# Altium schematic symbol library Hydra_Ref_sch.SCHLIB: 791 symbols (part 4 of 5) (continued)
## RK40-01500
designator R?, comment value 150  (hidden comment: 150 OHMS;.06W;1%;200PPM;FILM;CHIP;0603)
NoLoad: .; MFGR: ANY; Approved: CL; G_PN: RK40-01500; level: 1; ModifyDate: 11/20/12; M_PN: ANY; item_number: RK40-01500
footprint RES-0603-N (0603 Footprint)
pins: 1, 2

## RK40-01780
designator R?, comment value 178  (hidden comment: 178 OHMS;.1W;1%;200PPM;FILM;CHIP;0603)
NoLoad: .; MFGR: VENKEL; M_PN: CR0603-10W-1780FT; Approved: CL; G_PN: RK40-01780; level: 1; ModifyDate: 3/27/13; item_number: RK40-01780
footprint RES-0603-N (0603 Footprint)
pins: 1, 2

## RK40-02000
designator R?, comment value 200  (hidden comment: 200 OHMS;.06W;1%;200PPM;FILM;CHIP;0603)
NoLoad: .; MFGR: ANY; Approved: NM; G_PN: RK40-02000; level: 1; ModifyDate: 11/12/12; M_PN: ANY; item_number: RK40-02000
footprint RES-0603-N (0603 Footprint)
pins: 1, 2

## RK40-03010
designator R?, comment value 301  (hidden comment: 301 OHMS;.06W;1%;100PPM;FILM;CHIP;0603)
Approved: NM; G_PN: RK40-03010; NoLoad: .; MFGR: ANY; level: 1; ModifyDate: 3/18/13; M_PN: ANY; item_number: RK40-03010
footprint RES-0603-N (0603 Footprint)
pins: 1, 2

## RK40-03570
designator R?, comment value 357  (hidden comment: 357 OHMS;.06W;1%;100PPM;FILM;CHIP;0603)
Approved: NM; G_PN: RK40-03570; NoLoad: .; MFGR: ANY; level: 1; ModifyDate: 11/7/12; M_PN: ANY; item_number: RK40-03570
footprint RES-0603-N (0603 Footprint)
pins: 1, 2

## RK40-04530
designator R?, comment value 453  (hidden comment: 453 OHMS;.06W;1%;100PPM;FILM;CHIP;0603)
Approved: NM; G_PN: RK40-04530; NoLoad: .; MFGR: ANY; level: 1; ModifyDate: 2/1/14; M_PN: ANY; item_number: RK40-04530
footprint RES-0603-N (0603 Footprint)
pins: 1, 2

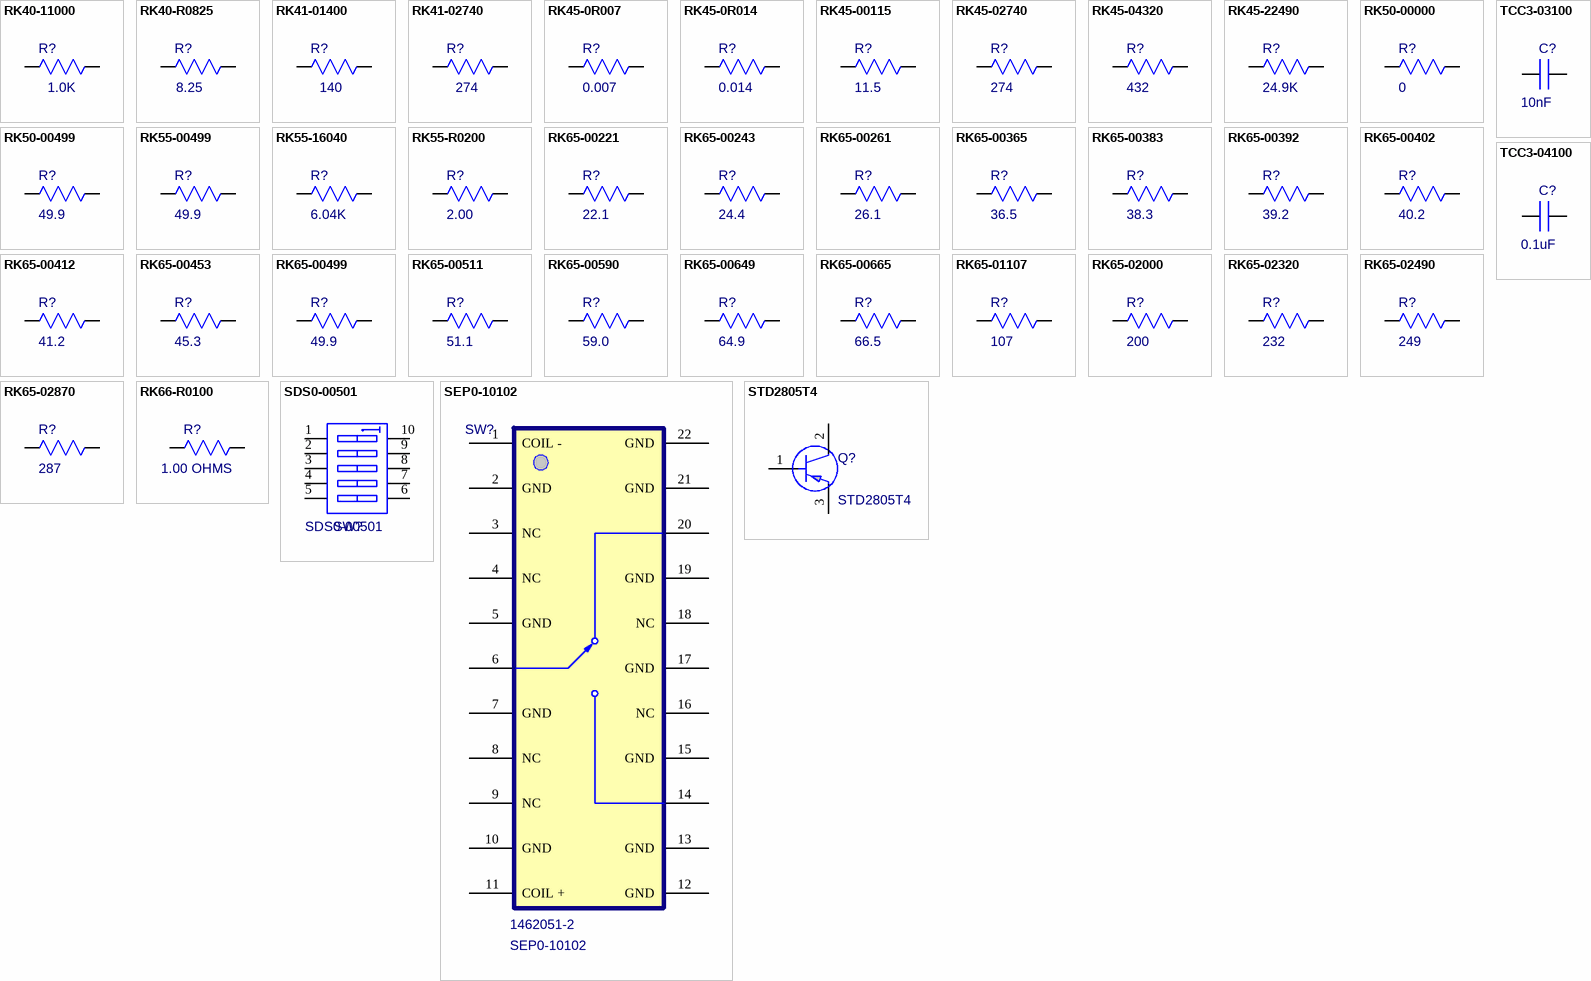
[diagram p17: symbols RK40-11000 to TCC3-04100]

## RK40-11000
designator R?, comment value 1.0K  (hidden comment: 1.0K OHMS;.06W;1%;200PPM;FILM;CHIP;0603)
NoLoad: .; MFGR: ANY; Approved: NM; G_PN: RK40-11000; level: 1; ModifyDate: 11/13/12; M_PN: ANY; item_number: RK40-11000
footprint RES-0603-N (0603 Footprint)
pins: 1, 2

## RK40-R0825
designator R?, comment value 8.25  (hidden comment: 8.25 OHMS;.06W;1%;200PPM;FILM;CHIP;0603)
NoLoad: .; MFGR: ANY; Approved: NM; G_PN: RK40-R0825; level: 1; ModifyDate: 11/20/12; M_PN: ANY; item_number: RK40-R0825
footprint RES-0603-N (0603 Footprint)
pins: 1, 2

## RK41-01400
designator R?, comment value 140  (hidden comment: 140 OHMS;.1W;1%;200PPM;FILM;CHIP;0603)
NoLoad: .; MFGR: VENKEL; M_PN: CR0603-10W-1300FT; Approved: CL; G_PN: RK41-01400; level: 1; ModifyDate: 3/27/13; item_number: RK41-01400
footprint RES-0603-N (0603 Footprint)
pins: 1, 2

## RK41-02740
designator R?, comment value 274  (hidden comment: 274 OHMS;.1W;1%;100PPM;FILM;CHIP;0603)
NoLoad: .; MFGR: PANASONIC; M_PN: ERJ-3EKF2740V; Approved: CL; G_PN: RK41-02740; level: 1; ModifyDate: 7/24/14; item_number: RK41-02740
footprint RES-0603-N (0603 Footprint)
pins: 1, 2

## RK45-0R007
designator R?, comment value 0.007  (hidden comment: .007 OHMS;.5W;1%;150PPM;FILM CHIP;0805)
G_PN: RK45-0R007; Approved: CL; NoLoad: .; MFGR: RHOM; M_PN: PMR10EZPFU7L00; level: 1; ModifyDate: 5/6/13; item_number: RK45-0R007
footprint RES-0805-N
pins: 1, 2

## RK45-0R014
designator R?, comment value 0.014  (hidden comment: .014 OHMS;.5W;1%;75PPM;METAL FILM CHIP;0805)
G_PN: RK45-0R014; Approved: CL; NoLoad: .; MFGR: VISHAY; M_PN: ANY; level: 1; ModifyDate: 5/6/13; item_number: RK45-0R014
footprint RES-0805-N
pins: 1, 2

## RK45-00115
designator R?, comment value 11.5  (hidden comment: 11.5 OHMS;.1W;1%;100PPM;FILM CHIP;0805)
G_PN: RK45-00115; Approved: CL; NoLoad: .; MFGR: ANY; level: 1; ModifyDate: 3/18/13; M_PN: ANY; item_number: RK45-00115
footprint RES-0805-N
pins: 1, 2

## RK45-02740
designator R?, comment value 274  (hidden comment: 274 OHMS;.1W;1%;100PPM;FILM CHIP;0805)
G_PN: RK45-02740; Approved: CL; NoLoad: .; MFGR: ANY; level: 1; ModifyDate: 3/18/13; M_PN: ANY; item_number: RK45-02740
footprint RES-0805-N
pins: 1, 2

## RK45-04320
designator R?, comment value 432  (hidden comment: 432 OHMS;.1W;1%;100PPM;FILM CHIP;0805)
G_PN: RK45-04320; Approved: CL; NoLoad: .; MFGR: ANY; level: 1; ModifyDate: 3/18/13; M_PN: ANY; item_number: RK45-04320
footprint RES-0805-N
pins: 1, 2

## RK45-22490
designator R?, comment value 24.9K  (hidden comment: 24.9 KOHMS;.1W;1%;100PPM;FILM CHIP;0805)
G_PN: RK45-22490; Approved: CL; NoLoad: .; MFGR: ANY; level: 1; ModifyDate: 8/27/12; M_PN: ANY; item_number: RK45-22490
footprint RES-0805-N
pins: 1, 2

## RK50-00000
designator R?, comment value 0  (hidden comment: JUMPER;0 OHMS;.125W;100PPM;FILM;1206)
G_PN: RK50-00000; NoLoad: .; MFGR: ANY; level: 1; ModifyDate: 1/10/14; M_PN: ANY; item_number: RK50-00000
footprint RES-1206-N (METRIC 3225)
pins: 1, 2

## RK50-00499
designator R?, comment value 49.9  (hidden comment: 49.9 OHMS;.125W;1%;100PPM;FILM;1206)
G_PN: RK50-00499; NoLoad: .; Approved: CL; MFGR: KOA; M_PN: RK73H2BT; level: 1; ModifyDate: 6/10/12; item_number: RK50-00499
footprint RES-1206-N (METRIC 3225)
pins: 1, 2

## RK55-00499
designator R?, comment value 49.9  (hidden comment: 49.9 OHMS;.33W;1%;100PPM;FILM;1210)
G_PN: RK55-00499; NoLoad: .; Approved: CL; MFGR: VISHAY/DALE; M_PN: CRCW121049R9FKTAP; level: 1; ModifyDate: 4/11/12; item_number: RK55-00499
footprint RES-1210-N (Footprint not found)
pins: 1, 2

## RK55-16040
designator R?, comment value 6.04K  (hidden comment: 6.04k OHMS;.25W;1%;100PPM;FILM;1210)
G_PN: RK55-16040; Approved: CL; NoLoad: .; MFGR: ANY; level: 1; ModifyDate: 7/11/12; M_PN: ANY; item_number: RK55-16040
footprint RES-1210-N (Footprint not found)
pins: 1, 2

## RK55-R0200
designator R?, comment value 2.00  (hidden comment: 2.00 OHMS;.5W;1%;200PPM;FILM;1210)
G_PN: RK55-R0200; NoLoad: .; Approved: NM; MFGR: VISHAY/DALE; M_PN: CRCW1210....E3; level: 1; ModifyDate: 11/20/12; item_number: RK55-R0200
footprint RES-1210-N (Footprint not found)
pins: 1, 2

## RK65-00221
designator R?, comment value 22.1  (hidden comment: 22.1 OHMS;0.5W;1%;100PPM;THICK FILM;CHIP;2010;RoHS)
NoLoad: .; MFGR: ROHM; Approved: CL; M_PN: MCR50JZHF22R1; G_PN: RK65-00221; level: 1; ModifyDate: 4/26/12; item_number: RK65-00221
footprint RES-2010-N
pins: 1, 2

## RK65-00243
designator R?, comment value 24.4  (hidden comment: 24.3 OHMS;.5W;1%;100PPM;THICK FILM;CHIP;2010;RoHS)
NoLoad: .; MFGR: ROHM; Approved: CL; M_PN: MCR50JZHF24R3; G_PN: RK65-00243; level: 1; ModifyDate: 4/26/12; item_number: RK65-00243
footprint RES-2010-N
pins: 1, 2

## RK65-00261
designator R?, comment value 26.1  (hidden comment: 26.1 OHM;.75W;1%;100PPM;FILM CHIP;2010)
G_PN: RK65-00261; NoLoad: .; Approved: CL; MFGR: VISHAY/DALE; M_PN: CRCW201026R1FKEF; level: 1; ModifyDate: 3/6/13; item_number: RK65-00261
footprint RES-2010-N
pins: 1, 2

## RK65-00365
designator R?, comment value 36.5  (hidden comment: 36.5 OHM;.75W;1%;100PPM;FILM CHIP;2010)
G_PN: RK65-00365; NoLoad: .; Approved: CL; MFGR: VISHAY/DALE; M_PN: CRCW201036R5FKEF; level: 1; ModifyDate: 3/1/13; item_number: RK65-00365
footprint RES-2010-N
pins: 1, 2

## RK65-00383
designator R?, comment value 38.3  (hidden comment: 38.3 OHM;.75W;1%;100PPM;FILM CHIP;2010)
G_PN: RK65-00383; NoLoad: .; Approved: CL; MFGR: VISHAY/DALE; M_PN: CRCW201038R3FKEF; level: 1; ModifyDate: 3/1/13; item_number: RK65-00383
footprint RES-2010-N
pins: 1, 2

## RK65-00392
designator R?, comment value 39.2  (hidden comment: 39.2 OHM;.75W;1%;100PPM;FILM CHIP;2010)
G_PN: RK65-00392; NoLoad: .; Approved: CL; MFGR: VISHAY/DALE; M_PN: CRCW201039R2FKEF; level: 1; ModifyDate: 10/14/14; item_number: RK65-00392
footprint RES-2010-N
pins: 1, 2

## RK65-00402
designator R?, comment value 40.2  (hidden comment: 40.2 OHM;.5W;1%;100PPM;FILM CHIP;2010)
G_PN: RK65-00402; NoLoad: .; Approved: CL; MFGR: VISHAY/DALE; M_PN: CRCW201040R2FKEF; level: 1; ModifyDate: 4/9/12; item_number: RK65-00402
footprint RES-2010-N
pins: 1, 2

## RK65-00412
designator R?, comment value 41.2  (hidden comment: 41.2 OHMS;.75W;1%;100PPM;THICK FILM;CHIP;2010;RoHS)
G_PN: RK65-00412; NoLoad: .; Approved: CL; MFGR: VISHAY/DALE; M_PN: CRCW201041R2FKEF; level: 1; ModifyDate: 3/18/12; item_number: RK65-00412
footprint RES-2010-N
pins: 1, 2

## RK65-00453
designator R?, comment value 45.3  (hidden comment: 45.3 OHMS;0.75W;1%;100PPM;THICK FILM;CHIP;2010;RoHS)
NoLoad: .; MFGR: VISHAY/DALE; Approved: CL; M_PN: CRCW201045R3FKEF; G_PN: RK65-00453; level: 1; ModifyDate: 02/22/12; item_number: RK65-00453
footprint RES-2010-N
pins: 1, 2

## RK65-00499
designator R?, comment value 49.9  (hidden comment: 49.9 OHMS;.5W;1%;100PPM;THICK FILM;CHIP;2010;RoHS)
NoLoad: .; MFGR: ROHM; Approved: CL; M_PN: MCR50JZHF49R9; G_PN: RK65-00499; level: 1; ModifyDate: 4/26/12; item_number: RK65-00499
footprint RES-2010-N
pins: 1, 2

## RK65-00511
designator R?, comment value 51.1  (hidden comment: 51.1 OHM;.75W;1%;100PPM;FILM CHIP;2010)
G_PN: RK65-00511; NoLoad: .; Approved: CL; MFGR: VISHAY/DALE; M_PN: CRCW201040R2FKEF; level: 1; ModifyDate: 2/28/13; item_number: RK65-00511
footprint RES-2010-N
pins: 1, 2

## RK65-00590
designator R?, comment value 59.0  (hidden comment: 59.0 OHMS;.5W;1%;100PPM;THICK FILM;CHIP;2010;RoHS)
NoLoad: .; MFGR: ROHM; Approved: CL; M_PN: MCR50JZHF59R0; G_PN: RK65-00590; level: 1; ModifyDate: 5/4/12; item_number: RK65-00590
footprint RES-2010-N
pins: 1, 2

## RK65-00649
designator R?, comment value 64.9  (hidden comment: 64.9 OHMS;.75W;1%;100PPM;THICK FILM;CHIP;2010;RoHS)
NoLoad: .; MFGR: VISHAY/DALE; Approved: CL; M_PN: CRCW201064R9FKEF; G_PN: RK65-00649; level: 1; ModifyDate: 5/4/12; item_number: RK65-00649
footprint RES-2010-N
pins: 1, 2

## RK65-00665
designator R?, comment value 66.5  (hidden comment: 66.5 OHMS;.5W;1%;100PPM;THICK FILM;CHIP;2010;RoHS)
NoLoad: .; MFGR: RHOM; Approved: CL; M_PN: MCR50JZHF66R5; G_PN: RK65-00665; level: 1; ModifyDate: 5/4/12; item_number: RK65-00665
footprint RES-2010-N
pins: 1, 2

## RK65-01107
designator R?, comment value 107  (hidden comment: 107 OHMS;0.75W;1%;100PPM;THICK FILM;CHIP;2010;RoHS)
NoLoad: .; MFGR: VISHAY/DALE; Approved: CL; M_PN: CRCW2010107RFKEF; G_PN: RK65-01107; level: 1; ModifyDate: 4/23/13; item_number: RK65-01107
footprint RES-2010-N
pins: 1, 2

## RK65-02000
designator R?, comment value 200  (hidden comment: 200 OHMS;0.75W;1%;100PPM;THICK FILM;CHIP;2010;RoHS)
NoLoad: .; MFGR: VISHAY/DALE; Approved: CL; M_PN: CRCW2010200RFKEF; G_PN: RK65-02000; level: 1; ModifyDate: 02/22/12; item_number: RK65-02000
footprint RES-2010-N
pins: 1, 2

## RK65-02320
designator R?, comment value 232  (hidden comment: 232 OHMS;0.5W;1%;100PPM;THICK FILM;CHIP;2010;RoHS)
NoLoad: .; MFGR: ROHM; Approved: CL; M_PN: MCR50JZHF2320; G_PN: RK65-02320; level: 1; ModifyDate: 4/11/12; item_number: RK65-02320
footprint RES-2010-N
pins: 1, 2

## RK65-02490
designator R?, comment value 249  (hidden comment: 249 OHMS;.5W;1%;100PPM;FILM CHIP;2010)
G_PN: RK65-02490; NoLoad: .; Approved: CL; MFGR: ANY; level: 1; ModifyDate: 02/22/12; M_PN: ANY; item_number: RK65-02490
footprint RES-2010-N
pins: 1, 2

## RK65-02870
designator R?, comment value 287  (hidden comment: 287 OHMS;0.75W;1%;100PPM;THICK FILM;CHIP;2010;RoHS)
G_PN: RK65-02870; NoLoad: .; Approved: CL; MFGR: ANY; M_PN: CRCW2010287RFKEF; level: 1; ModifyDate: 5/3/12; item_number: RK65-02870
footprint RES-2010-N
pins: 1, 2

## RK66-R0100
designator R?, comment value 1.00 OHMS  (hidden comment: 1.00 OHMS;1W;1%;100PPM;HI PULSE PWR;FILM CHIP;2010)
NoLoad: .; MFGR: VISHAY; Approved: NM; M_PN: CRCW20101FKEFHP; G_PN: RK66-R0100; level: 1; ModifyDate: 10/24/12; item_number: RK66-R0100
footprint RES-2010-N
pins: 1, 2

## SDS0-00501
designator SW?, comment G_PN: SDS0-00501  (hidden comment: SWITCH;DIP;5PST;LOW PROFILE;SMT)
MFGR: C&K; Approved: CL; NoLoad: .; Value: SDA05H0SBR; M_PN: SDA05H0SB; level: 1; ModifyDate: 02/22/12; item_number: SDS0-00501
footprint SW-SDA05H0SBR (Low profile DIP Swithch)
pins: 1 A1, 2 A2, 3 A3, 4 A4, 5 A5, 6 B5, 7 B4, 8 B3, 9 B2, 10 B1

## SEP0-10102
designator SW?, comment M_PN: 1462051-2  G_PN: SEP0-10102  (hidden comment: RELAY; RF; SPDT; 12V COIL; .14W; SMT-J)
Value: 1462051-2; Approved: CL; NoLoad: .; MFGR: Tyco Electronics; level: 1; ModifyDate: 02/22/12; item_number: SEP0-10102
footprint HF3 (Footprint not found)
pins: 1 COIL -, 2 GND, 3 NC, 4 NC, 5 GND, 6, 7 GND, 8 NC, 9 NC, 10 GND, 11 COIL +, 12 GND, 13 GND, 14, 15 GND, 16 NC, 17 GND, 18 NC, 19 GND, 20, 21 GND, 22 GND

## STD2805T4
designator Q?, comment M_PN: STD2805T4  (hidden comment: BJT;PNP;5A;60V VCEO;15W;85 MIN HFE;DPAK)
Value: STD2805T4; NoLoad: .; Approved: CL; MFGR: STMICROELECTRONICS; level: 1; ModifyDate: 4/30/12
footprint TO-252/DPAK_REVA
footprint TO-252_DPAK_REVA
pins: 1 BASE, 2 COLLECTOR, 3 EMITTER

## TCC3-03100
designator C?, comment value 10nF  (hidden comment: 10nF;10%;X7R;16 WVDC;CHIP;0402)
G_PN: TCC3-03100; Approved: CL; MFGR: ATC; M_PN: ATC520L103KT16T; NoLoad: .; level: 1; ModifyDate: 4/26/13; item_number: TCC3-03100
footprint CAP-0402-N (0402 Footprint)
pins: 1, 2

## TCC3-04100
designator C?, comment value 0.1uF  (hidden comment: 0.1F;10%;X7R;16 WVDC;CHIP;0402)
G_PN: TCC3-04100; Approved: CL; MFGR: Kyocera/AVX; M_PN: GX02YD104KAT2-500; NoLoad: .; level: 1; ModifyDate: 7/1/14; item_number: TCC3-04100
footprint CAP-0402-N (0402 Footprint)
pins: 1, 2

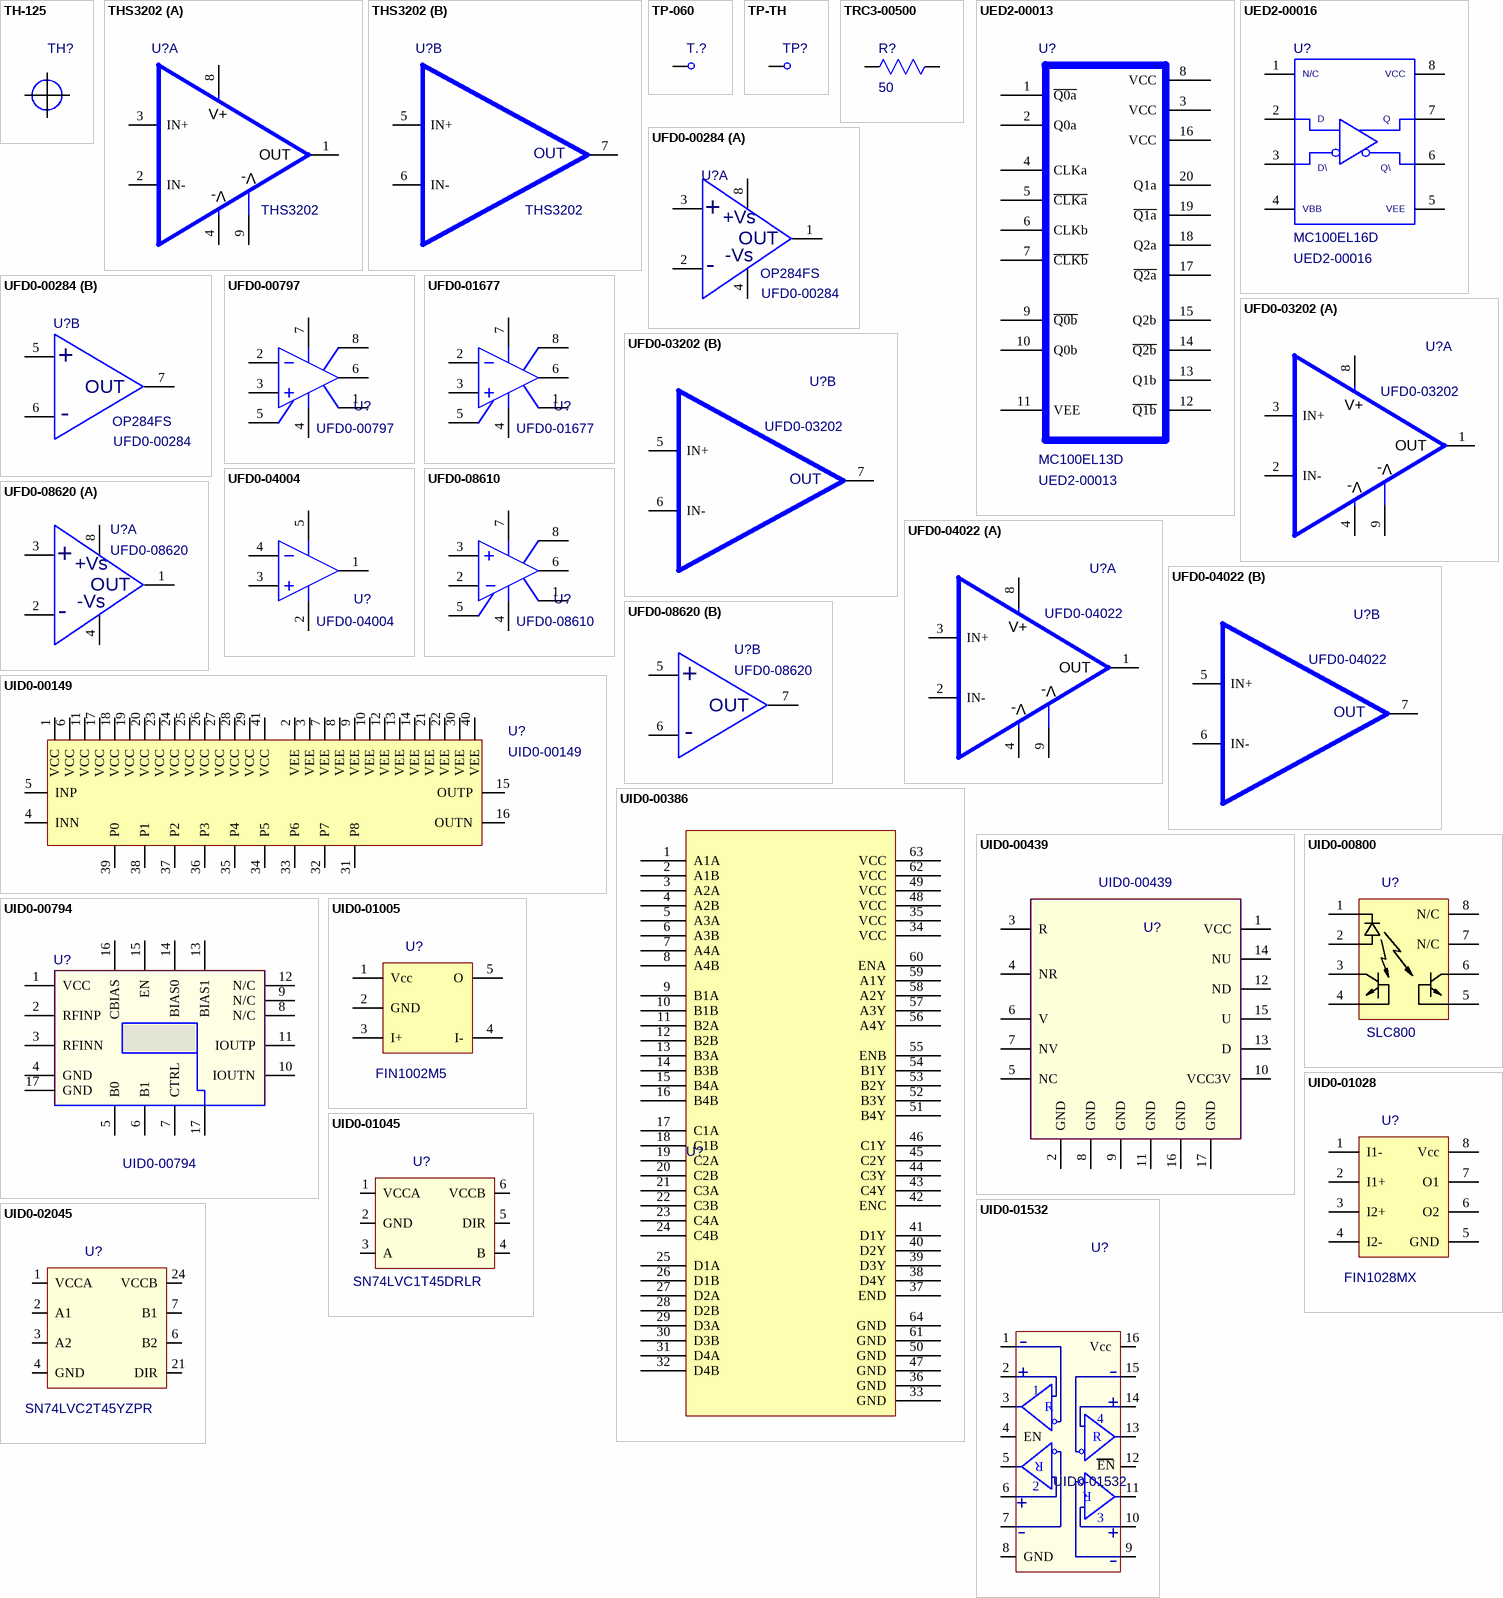
[diagram p18: symbols TH-125 to UID0-02045]

## TH-125
designator TH?, comment N/L  (value not drawn)  (no BOM)
Tooling Hole 125; level: 1; NoLoad: N/L; ModifyDate: 02/14/2008 14:07:19; Value: *
footprint TH-125 (Tooling Hole 125)

## THS3202
designator U?, comment M_PN: THS3202  (hidden comment: Amplifier)
Value: LM393M; NoLoad: .; Approved: CL; MFGR: Texas Instruments; level: 1; ModifyDate: 10/27/12; G_PN: THS3202; item_number: THS3202
footprint SOIC65P490X110-9P (SOIC, 8+1 Leads, Body 3x3mm (nominal), Pitch .65mm, IPC Medium Density)
part A pins: 1 OUT, 2 IN-, 3 IN+, 4 V-, 8 V+, 9 V-
part B pins: 5 IN+, 6 IN-, 7 OUT

## TP-060
designator T.?  (no BOM)
NoLoad: N/L; Approved: NM; level: 1; MFGR: N/A; M_PN: N/A
footprint TP-060 (Footprint not found)
pins: 1

## TP-TH
designator TP?
NoLoad: N/L; Approved: NM; level: 1; MFGR: N/A; M_PN: N/A
footprint TP-100H150P (Test Point 100 hole 150 pad)
pins: 1

## TRC3-00500
designator R?, comment value 50  (hidden comment: RES;50 OHM;CHIP;5%;250PPM;PART WRAP;0402)
G_PN: TRC3-00500; NoLoad: .; Approved: CL; MFGR: ANY; level: 1; ModifyDate: 02/27/13; M_PN: ANY; item_number: TRC3-00500
footprint RES-0402-N (0402 Footprint)
pins: 1, 2

## UED2-00013
designator U?, comment value MC100EL13D  G_PN: UED2-00013  (hidden comment: BUFFER;DUAL 1:3;DIFF;500PS TPD;SO-20L)
NoLoad: .; Approved: CL; MFGR: ON SEMI; level: 1; M_PN: MC100EL13D; ModifyDate: 4/21/12; item_number: UED2-00013
footprint SO20WB-380-REV-A_UED2-00013()
footprint SO20WB-380-REV-A
pins: 1 ~{Q0a}, 2 Q0a, 3 VCC, 4 CLKa, 5 ~{CLKa}, 6 CLKb, 7 ~{CLKb}, 8 VCC, 9 ~{Q0b}, 10 Q0b, 11 VEE, 12 ~{Q1b}, 13 Q1b, 14 ~{Q2b}, 15 Q2b, 16 VCC, 17 ~{Q2a}, 18 Q2a, 19 ~{Q1a}, 20 Q1a

## UED2-00016
designator U?, comment value MC100EL16D  G_PN: UED2-00016  (hidden comment: RECEIVER;DIFFERENTIAL;25OPS PROP;225PSRT)
NoLoad: .; Approved: CL; MFGR: ON SEMI; level: 1; M_PN: MC100EL16D; ModifyDate: 4/21/12; item_number: UED2-00016
footprint SO8_MS-012 (JEDEC M-012)
pins: 1 N/C, 2 D, 3 ~{D}, 4 VBB, 5 VEE, 6 ~{Q}, 7 Q, 8 VCC

## UFD0-00284
designator U?, comment M_PN: OP284FS  G_PN: UFD0-00284  (hidden comment: OP AMP;DUAL;PREC;R-R;4MHZ;SO-8)
Value: OP284FS; NoLoad: .; Approved: CL; MFGR: ANALOG DEVICES; level: 1; ModifyDate: 02/22/12; item_number: UFD0-00284
footprint SO8_MS-012 (JEDEC M-012)
part A pins: 1 OUT, 2 -IN, 3 +IN, 4 V-, 8 V+
part B pins: 5 +IN, 6 -IN, 7 OUT
part A text: +; +Vs; -Vs; -
part B text: +; -

## UFD0-00797
designator U?, comment G_PN: UFD0-00797  (hidden comment: OP AMP;LOW NOISE;1UV/DEG;8MHZ GBW @10;30V;SO-8)
MFGR: ANALOG DEVICES; NoLoad: .; Approved: CL; Value: AD797AR; level: 1; ModifyDate: 02/22/12; M_PN: AD797AR; item_number: UFD0-00797
footprint SO-8C_N
pins: 1 OS NUL, 2 IN-, 3 IN+, 4 V-, 5 OS NUL, 6 OUT, 7 V+, 8 TAB

## UFD0-01677
designator U?, comment G_PN: UFD0-01677  (hidden comment: OP AMP;4NV/HZ;0.2UV/C;60UV OFFSET;SO-8)
MFGR: LINEAR TECHNOLOGY; NoLoad: .; Approved: CL; Value: LT1677CS8PBF; level: 1; ModifyDate: 10/08/12; M_PN: LT1677CS8PBF; item_number: UFD0-01677
footprint SO-8C_N
pins: 1 OS NUL, 2 IN-, 3 IN+, 4 V-, 5 OS NUL, 6 OUT, 7 V+, 8 TAB

## UFD0-03202
designator U?, comment G_PN: UFD0-03202  (hidden comment: OP AMP;DUAL;CURRENT FDBK;2GHZ;+15V SUP;115MA OUT;MSOP-8 W/BOT PAD)
Value: LM393M; NoLoad: .; Approved: NM; MFGR: Texas Instruments; M_PN: THS3202; level: 1; ModifyDate: 12/04/12; item_number: UFD0-03202
footprint SOIC65P490X110-9P (SOIC, 8+1 Leads, Body 3x3mm (nominal), Pitch .65mm, IPC Medium Density)
part A pins: 1 OUT, 2 IN-, 3 IN+, 4 V-, 8 V+, 9 V-
part B pins: 5 IN+, 6 IN-, 7 OUT

## UFD0-04004
designator U?, comment G_PN: UFD0-04004  (hidden comment: OP AMP;1.8NV/HZ;0.7UV/C MAX;125UV OFFSET MAX;SOT-23-5;RoHS)
MFGR: ANALOG DEVICES; NoLoad: .; Approved: CL; Value: ADA4004-1ARJZ-R7; level: 1; ModifyDate: 5/12/13; M_PN: ADA4004-1ARJZ-R7; item_number: UFD0-04004
footprint SOT23-5_ANALOG
pins: 1 OUT, 2 V-, 3 IN+, 4 IN-, 5 V+

## UFD0-04022
designator U?, comment G_PN: UFD0-04022  (hidden comment: OP AMP;350-MHz Low-Noise Voltage-Feedback Amplifier, Dual)
Value: THS4022CDGN; NoLoad: .; Approved: NM; MFGR: Texas Instruments; level: 1; ModifyDate: 6/18/14; M_PN: THS4022CDGN; item_number: UFD0-04022
footprint SOIC65P490X110-9P (SOIC, 8+1 Leads, Body 3x3mm (nominal), Pitch .65mm, IPC Medium Density)
part A pins: 1 OUT, 2 IN-, 3 IN+, 4 V-, 8 V+, 9 V-
part B pins: 5 IN+, 6 IN-, 7 OUT

## UFD0-08610
designator U?, comment G_PN: UFD0-08610  (hidden comment: OP-AMP;PRECISION;LOW CURRENT;LOW NOISE;WIDE)
MFGR: ANALOG DEVICES; NoLoad: .; Approved: CL; Value: AD8610BRZ; level: 1; ModifyDate: 2/19/13; M_PN: AD8610BRZ; item_number: UFD0-08610
footprint SO-8C_N
pins: 1 OS NUL, 2 IN-, 3 IN+, 4 V-, 5 OS NUL, 6 OUT, 7 V+, 8 TAB

## UFD0-08620
designator U?, comment G_PN: UFD0-08620  (hidden comment: OP-AMP;DUAL:PRECISION;LOW CURRENT;LOW NOISE;WIDE)
Value: AD8620; NoLoad: .; Approved: CL; MFGR: ANALOG DEVICES; level: 1; ModifyDate: 02/20/13; M_PN: AD8620; item_number: UFD0-08620
footprint SO8_MS-012 (JEDEC M-012)
part A pins: 1 OUT, 2 -IN, 3 +IN, 4 V-, 8 V+
part B pins: 5 +IN, 6 -IN, 7 OUT
part A text: +; +Vs; -Vs; -
part B text: +; -

## UID0-00149
designator U?, comment G_PN: UID0-00149  (hidden comment: PRESCALER;DIVIDE-BY-8 TO F11;0-14GHz;-3.3V SUP;-16/10dBm IN;4dBm O;6X6mm QFN-40)
NoLoad: .; Approved: NM; Value: UID0-00149; MFGR: CENTELLAX; M_PN: UXN14M9P; level: 1; ModifyDate: 11/19/12; item_number: UID0-00149
footprint QFN50P600X600X100-40N (QFN, 40-Leads, Body 6.0x6.0mm (max), Pitch 0.50mm, IPC Medium Density)
pins: 1 VCC, 2 VEE, 3 VEE, 4 INN, 5 INP, 6 VCC, 7 VEE, 8 VEE, 9 VEE, 10 VEE, 11 VCC, 12 VEE, 13 VEE, 14 VEE, 15 OUTP, 16 OUTN, 17 VCC, 18 VCC, 19 VCC, 20 VCC, 21 VEE, 22 VEE, 23 VCC, 24 VCC, 25 VCC, 26 VCC, 27 VCC, 28 VCC, 29 VCC, 30 VEE, 31 P8, 32 P7, 33 P6, 34 P5, 35 P4, 36 P3, 37 P2, 38 P1, 39 P0, 40 VEE, 41 VCC

## UID0-00386
designator U?
16 LINE RECEIVERS;LVDS;3.3V SUPPLY;TSSOP-64; NoLoad: .; Approved: NM; MFGR: TEXAS INSTRUMENT; M_PN: SN65LVDS386DGG; level: 1; G_PN: UID0-00386; item_number: UID0-00386
footprint SOP50P810X120-64M (SOP, 64-Leads, Body 17.1x6.2mm (max), Pitch 0.50mm)
pins: 1 A1A, 2 A1B, 3 A2A, 4 A2B, 5 A3A, 6 A3B, 7 A4A, 8 A4B, 9 B1A, 10 B1B, 11 B2A, 12 B2B, 13 B3A, 14 B3B, 15 B4A, 16 B4B, 17 C1A, 18 C1B, 19 C2A, 20 C2B, 21 C3A, 22 C3B, 23 C4A, 24 C4B, 25 D1A, 26 D1B, 27 D2A, 28 D2B, 29 D3A, 30 D3B, 31 D4A, 32 D4B, 33 GND, 34 VCC, 35 VCC, 36 GND, 37 END, 38 D4Y, 39 D3Y, 40 D2Y, 41 D1Y, 42 ENC, 43 C4Y, 44 C3Y, 45 C2Y, 46 C1Y, 47 GND, 48 VCC, 49 VCC, 50 GND, 51 B4Y, 52 B3Y, 53 B2Y, 54 B1Y, 55 ENB, 56 A4Y, 57 A3Y, 58 A2Y, 59 A1Y, 60 ENA, 61 GND, 62 VCC, 63 VCC, 64 GND

## UID0-00439
designator U?
DIG PHASE-FREQ DET;10-1300MHz;QS-16; M_PN: HMC439QS16G; Value: HMC439QS16G; NoLoad: .; Approved: CL; MFGR: HITTITE; level: 1; ModifyDate: 5/31/13; item_number: UID0-00439; G_PN: UID0-00439
footprint QS16G_HITTITE (Hittite 16+1 Pin Plastic SSOP)
pins: 1 VCC, 2 GND, 3 R, 4 NR, 5 NC, 6 V, 7 NV, 8 GND, 9 GND, 10 VCC3V, 11 GND, 12 ND, 13 D, 14 NU, 15 U, 16 GND, 17 GND

## UID0-00794
designator U?, comment G_PN: UID0-00794  (hidden comment: PRESCALER;2-BIT PROG;0.2-2GHz;-2/10dBm IN;10dBm O;3X3 mm LP-16 W/BOT PAD)
Value: HMC794LP3E; NoLoad: .; Approved: NM; MFGR: Hittite; level: 1; ModifyDate: 2/25/13; M_PN: HMC794LP3E; item_number: UID0-00794
footprint QFN-16_HITTITE_LP3 (QFN-16 HITTITE)
pins: 1 VCC, 2 RFINP, 3 RFINN, 4 GND, 5 B0, 6 B1, 7 CTRL, 8 N/C, 9 N/C, 10 IOUTN, 11 IOUTP, 12 N/C, 13 BIAS1, 14 BIAS0, 15 EN, 16 CBIAS, 17 GND, 17 GND

## UID0-00800
designator U?, comment M_PN: SLC800  (hidden comment: LINEAR OPTOCOUPLER;MATCH DUAL OUTPUT;SMT 8 PIN;6V;500MW;)
NoLoad: .; Approved: CL; MFGR: SOLID STATE OPTRONICS; G_PN: UID0-00800; level: 1; ModifyDate: 5/10/12; item_number: UID0-00800
footprint SO8_SLC800 (SOLID STATE OPTRONICS 8 PIN SMD)
pins: 1 -LED, 2 +LED, 3 +Vcc1, 4 I1, 5 I2, 6 +Vcc2, 7 N/C, 8 N/C

## UID0-01005
designator U?, comment M_PN: FIN1002M5  (hidden comment: 1 LINE RECEIVER;LVDS;3.3V SUPPLY;SOT-23-5)
Value: FIN1002M5; NoLoad: .; Approved: CL; MFGR: TI; G_PN: UID0-01005; level: 1; ModifyDate: 5/10/12; item_number: UID0-01005
footprint SOT23-5 (Footprint not found)
pins: 1 Vcc, 2 GND, 3 I+, 4 I-, 5 O

## UID0-01028
designator U?, comment M_PN: FIN1028MX  (hidden comment: 2 LINE RECEIVERS;LVDS;3.3V SUPPLY;SOIC-8)
Value: FIN1028MX; NoLoad: .; Approved: CL; MFGR: TI; G_PN: UID0-01028; level: 1; ModifyDate: 5/10/12; item_number: UID0-01028
footprint SOIC-8_N (Footprint not found)
pins: 1 I1-, 2 I1+, 3 I2+, 4 I2-, 5 GND, 6 O2, 7 O1, 8 Vcc

## UID0-01045
designator U?, comment M_PN: SN74LVC1T45DRLR  (hidden comment: SN74LVC1T45DRLR;1.6V/5.5V;1-bit;dual supply non-inverting level traslator;DRL package)
NoLoad: .; Approved: CL; MFGR: TEXAS INSTRUMENTS; G_PN: UID0-01045; level: 1; Value: SN74LVC1T45DRLR; ModifyDate: 3/22/13; item_number: UID0-01045
footprint DRL (TEXAS  INSTRUMENTS DRL PACKAGE)
pins: 1 VCCA, 2 GND, 3 A, 4 B, 5 DIR, 6 VCCB

## UID0-01532
designator U?
FIN1532 5V LVDS 4-Bit High Speed Differential Receiver;16-Lead TSSOP Package; MFGR: Fairchild Semiconductor; NoLoad: .; Approved: XiaoXiao; level: 1; ModifyDate: 07/31/2012; M_PN: FIN1532; G_PN: UID0-01532; item_number: UID0-01532
footprint MTC16 (16-Lead Thin Shrink Small Outline Package, L(5mm)XW(4.4mm)XH(1.1mm))
pins: 1 Rin1-, 2 Rin1+, 3 Rout1, 4 EN, 5 Rout2, 6 Rin2+, 7 Rin2-, 8 GND (power), 9 Rin3-, 10 Rin3+, 11 Rout3, 12 EN_Rev, 13 Rout4, 14 Rin4+, 15 Rin4-, 16 Vcc (power)
text: R

## UID0-02045
designator U?, comment M_PN: SN74LVC2T45YZPR  (hidden comment: SSN74LVC2T45YZPR;1.6V/5.5V;2-bit;dual supply non-inverting level traslator;YZP package)
NoLoad: .; Approved: CL; MFGR: TEXAS INSTRUMENTS; G_PN: UID0-02045; level: 1; Value: SN74LVC2T45YZPR; ModifyDate: 3/22/13; item_number: UID0-02045
footprint YZP8-TI (BGA, 8-Leads, Body 1.9x0.9mm, Pitch 0.5mm)
pins: 1 VCCA, 2 A1, 3 A2, 4 GND, 6 B2, 7 B1, 21 DIR, 24 VCCB

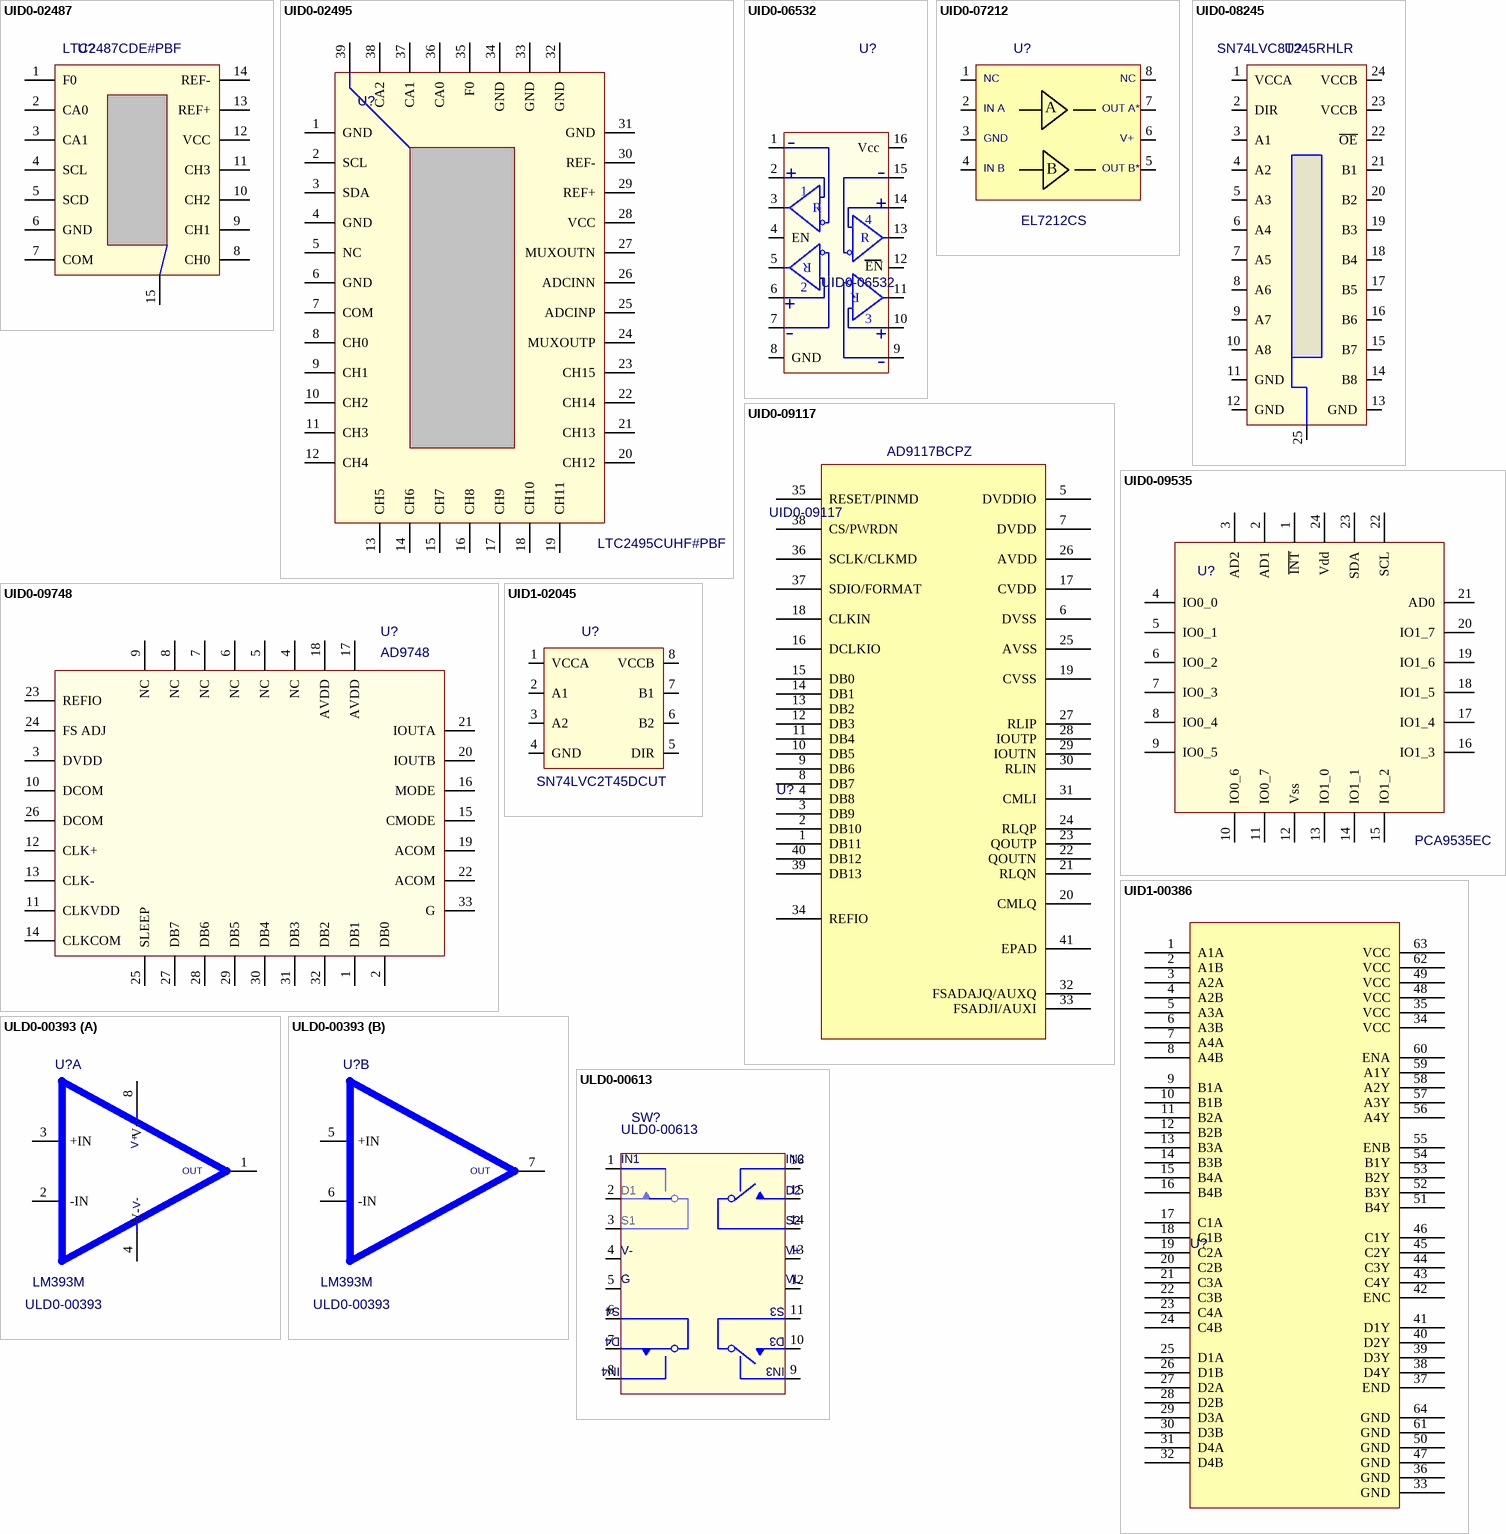
[diagram p19: symbols UID0-02487 to ULD0-00613]

## UID0-02487
designator U?, comment M_PN: LTC2487CDE#PBF  (hidden comment: ADC;16-BIT;2/4 CHANNEL;12SPS;INT REF;5V SUP;QFN14)
Value: LTC2487CDE#PBF; NoLoad: .; Approved: CL; MFGR: LINEAR TECHNOLOGY; G_PN: UID0-02487; level: 1; ModifyDate: 3/27/13; item_number: UID0-02487
footprint DFN14-LINEAR (14-Lead Plastic DFN (4mm × 3mm))
pins: 1 F0, 2 CA0, 3 CA1, 4 SCL, 5 SCD, 6 GND, 7 COM, 8 CH0, 9 CH1, 10 CH2, 11 CH3, 12 VCC, 13 REF+, 14 REF-, 15  

## UID0-02495
designator U?, comment M_PN: LTC2495CUHF#PBF  (hidden comment: ADC;16-BIT;DIFF;12SPS;INT REF;5V SUP;QFN38)
Value: LTC2495CUHF#PBF; NoLoad: .; Approved: CL; MFGR: LINEAR TECHNOLOGY; G_PN: UID0-02495; level: 1; ModifyDate: 3/26/13; item_number: UID0-02495
footprint QFN38-LT (Footprint not found)
pins: 1 GND, 2 SCL, 3 SDA, 4 GND, 5 NC, 6 GND, 7 COM, 8 CH0, 9 CH1, 10 CH2, 11 CH3, 12 CH4, 13 CH5, 14 CH6, 15 CH7, 16 CH8, 17 CH9, 18 CH10, 19 CH11, 20 CH12, 21 CH13, 22 CH14, 23 CH15, 24 MUXOUTP, 25 ADCINP, 26 ADCINN, 27 MUXOUTN, 28 VCC, 29 REF+, 30 REF-, 31 GND, 32 GND, 33 GND, 34 GND, 35 F0, 36 CA0, 37 CA1, 38 CA2, 39  

## UID0-06532
designator U?
SN65LVDS32PW 3.3V LVDS Receiver 16 Pin TSSOP; MFGR: TI; NoLoad: .; Approved: CL; level: 1; Value: SN65LVDS32PW; ModifyDate: 12/13/13; M_PN: SN65LVDS32PW; G_PN: UID0-06532; item_number: UID0-06532
footprint MTC16 (16-Lead Thin Shrink Small Outline Package, L(5mm)XW(4.4mm)XH(1.1mm))
pins: 1 Rin1-, 2 Rin1+, 3 Rout1, 4 EN, 5 Rout2, 6 Rin2+, 7 Rin2-, 8 GND (power), 9 Rin3-, 10 Rin3+, 11 Rout3, 12 EN_Rev, 13 Rout4, 14 Rin4+, 15 Rin4-, 16 Vcc (power)
text: R

## UID0-07212
designator U?, comment M_PN: EL7212CS  (hidden comment: DRIVER;20V;1.5A;20NS TR;25NS TD;SO-8W)
Value: EL7212CS; NoLoad: .; Approved: NM; MFGR: INTERSIL; G_PN: UID0-07212; level: 1; ModifyDate: 6/10/13; item_number: UID0-07212
footprint SOIC8_MS-012 (SOP, 8-Leads, Body 3.9x4.9mm, Pitch 1.27mm, IPC Medium Density)
pins: 1 NC, 2 INA, 3 GND, 4 IN B, 5 ~{OUTB}, 6 V+, 7 ~{OUTA}, 8 NC
text: IN A; A; OUT A*; B; OUT B*

## UID0-08245
designator U?, comment M_PN: SN74LVC8T245RHLR  (hidden comment: SN74LVC8T245RHLR;1.6V/5.5V;8-bit;dual supply non-inverting level traslator;QFN-RHL package)
NoLoad: .; Approved: CL; MFGR: TEXAS INSTRUMENTS; G_PN: UID0-08245; level: 1; Value: SN74LVC8T245RHLR; ModifyDate: 3/22/13; item_number: UID0-08245
footprint QFN-RHL-24 (RHL (R-PVQFN-N24); 5.5 X 3.5 MM)
pins: 1 VCCA, 2 DIR, 3 A1, 4 A2, 5 A3, 6 A4, 7 A5, 8 A6, 9 A7, 10 A8, 11 GND, 12 GND, 13 GND, 14 B8, 15 B7, 16 B6, 17 B5, 18 B4, 19 B3, 20 B2, 21 B1, 22 ~{OE}, 23 VCCB, 24 VCCB, 25 GND